# Altium footprint library ICs And Semiconductors THD.PcbLib: 350 footprints (part 9 of 22) (continued)
## HAMAMATSU_S11105 [mm] "22 Leads Dual In-Line Package, Row Spacing 10.16mm; Pitch 2.54mm" (continued)
3D body "HAMAMATSU_S11105.stp": height 3, standoff -4.3, extent -5.205,-15.875 5.205,15.875

## HAMAMATSU_S12572-010C [mm] "3x3mm Single Element MPPC (Multi-Pixel Photon Counter)"
height 4
pads (2):
  round 1.4 hole 0.7: 1(2,-1.27) 2(2,1.27)
Top Overlay:
  lines w0.2: 0.924,-1.5 -1.83,-1.5 -1.83,1.5 0.924,1.5 ; 0.988,-1.7 -2.03,-1.7 -2.03,1.7 0.988,1.7 ; 1.17,-0.548 1.17,0.548 ; 1.37,-0.368 1.37,0.368 ; 2.115,-2.45 2.115,-2.364 ; 2.115,-0.176 2.115,0.176 ; 2.115,2.364 2.115,2.45 ; 2.775,-2.051 2.775,-2.45 -2.775,-2.45 -2.775,2.45 2.775,2.45 2.775,2.051 ; 2.775,-0.489 2.775,0.489 ; -3.35,-3.025 -3.35,3.025 3.35,3.025 3.35,-3.025 -3.35,-3.025
  text "C" at 3.9,0.7 h1.2
  text "A" at 3.9,-1.8 h1.2
Notvisible:
  lines w0.1: -0.5,0 0,0 ; 0,-0.5 0,0 ; 0,0.5 0,0 ; 0.5,0 0,0 ; 1.5,-1.27 2,-1.27 ; 1.5,1.27 2,1.27 ; 2,-1.77 2,-1.27 ; 2,-0.77 2,-1.27 ; 2,0.77 2,1.27 ; 2,1.77 2,1.27 ; 2.5,-1.27 2,-1.27 ; 2.5,1.27 2,1.27
Mechanical 14:
  lines w0.1: 2.115,-2.45 2.115,2.45 ; -3.35,-3.025 -3.35,3.025 3.35,3.025 3.35,-3.025 -3.35,-3.025 ; -2.775,-2.45 2.775,-2.45 2.775,2.45 -2.775,2.45 -2.775,-2.45 ; -2.03,-1.7 1.37,-1.7 1.37,1.7 -2.03,1.7 -2.03,-1.7 ; -1.83,-1.5 1.17,-1.5 1.17,1.5 -1.83,1.5 -1.83,-1.5
3D body "HAMAMATSU_S12572-010C.stp": height 2.2, standoff -3.6, extent -3.275,-2.95 3.275,2.95

## INFINEON_ECONODUAL2 [mm] "INFINEON EconoDUAL 2 Module"
height 17.5
pads (16):
  round 2.4 hole 1.7: 1(-13.33,20.95) 2(-9.52,20.95) 3(13.34,20.95) 4(17.15,20.95) 7(28.58,-20.95) 8(24.77,-20.95) 9(-5.71,-20.95) 10(-9.52,-20.95) 11(-24.76,-20.95) 12(-28.57,-20.95)
  rrect20% 12x13 hole 6.5: 5(53.8,14) 6(53.8,-14) 13(-53.8,-14) 14(-53.8,14)
  round 1 hole 12 unplated mask+5.5: MEC(-46.5,0) MEC(46.5,0)
Top Overlay:
  lines w0.2: -52.025,-7 -52.025,7 ; -47.3,-19.15 47.3,-19.15 ; -47.3,19.15 47.3,19.15 ; 52.025,-7 52.025,7 ; -61,-22.5 -61,-6.028 -53.6,-6.028 -53.6,6.028 -61,6.028 -61,22.5 61,22.5 61,6.028 53.6,6.028 53.6,-6.028 61,-6.028 61,-22.5 -61,-22.5
  text "6" at 50.434,-6.7 h1.2
  text "5" at 50.134,5.4 h1.2
  text "14" at -50.78,5.45 h1.2
  text "13" at -50.78,-6.45 h1.2
  text "12" at -29.25,-18.6 h1.2
  text "11" at -25.44,-18.6 h1.2
  text "10" at -10.2,-18.6 h1.2
  text "9" at -5.99,-18.7 h1.2
  text "8" at 24.49,-18.7 h1.2
  text "7" at 28.3,-18.7 h1.2
  text "4" at 16.8,17.6 h1.2
  text "3" at 13.034,17.6 h1.2
  text "2" at -9.8,17.6 h1.2
  text "1" at -13.6,17.6 h1.2
Notvisible:
  circle w0.1: c-13.33,20.95 r1.5
  lines w0.1: -54.3,-14 -53.8,-14 ; -54.3,14 -53.8,14 ; -53.8,-14.5 -53.8,-14 ; -53.8,-13.5 -53.8,-14 ; -53.8,13.5 -53.8,14 ; -53.8,14.5 -53.8,14 ; -53.3,-14 -53.8,-14 ; -53.3,14 -53.8,14 ; -47,0 -46.5,0 ; -46.5,-0.5 -46.5,0 ; -46.5,0.5 -46.5,0 ; -46,0 -46.5,0 ; -29.07,-20.95 -28.57,-20.95 ; -28.57,-21.45 -28.57,-20.95 ; -28.57,-20.45 -28.57,-20.95 ; -28.07,-20.95 -28.57,-20.95 ; -25.26,-20.95 -24.76,-20.95 ; -24.76,-21.45 -24.76,-20.95 ; -24.76,-20.45 -24.76,-20.95 ; -24.26,-20.95 -24.76,-20.95 ; -13.83,20.95 -13.33,20.95 ; -13.33,20.45 -13.33,20.95 ; -13.33,21.45 -13.33,20.95 ; -12.83,20.95 -13.33,20.95 ; -10.02,-20.95 -9.52,-20.95 ; -10.02,20.95 -9.52,20.95 ; -9.52,-21.45 -9.52,-20.95 ; -9.52,-20.45 -9.52,-20.95 ; -9.52,20.45 -9.52,20.95 ; -9.52,21.45 -9.52,20.95 ; -9.02,-20.95 -9.52,-20.95 ; -9.02,20.95 -9.52,20.95 ; -6.21,-20.95 -5.71,-20.95 ; -5.71,-21.45 -5.71,-20.95 ; -5.71,-20.45 -5.71,-20.95 ; -5.21,-20.95 -5.71,-20.95 ; -0.5,0 0,0 ; 0,-0.5 0,0 ; 0,0.5 0,0 ; 0.5,0 0,0 ; 12.84,20.95 13.34,20.95 ; 13.34,20.45 13.34,20.95 ; 13.34,21.45 13.34,20.95 ; 13.84,20.95 13.34,20.95 ; 16.65,20.95 17.15,20.95 ; 17.15,20.45 17.15,20.95 ; 17.15,21.45 17.15,20.95 ; 17.65,20.95 17.15,20.95 ; 24.27,-20.95 24.77,-20.95 ; 24.77,-21.45 24.77,-20.95 ; 24.77,-20.45 24.77,-20.95 ; 25.27,-20.95 24.77,-20.95 ; 28.08,-20.95 28.58,-20.95 ; 28.58,-21.45 28.58,-20.95 ; 28.58,-20.45 28.58,-20.95 ; 29.08,-20.95 28.58,-20.95 ; 46,0 46.5,0 ; 46.5,-0.5 46.5,0 ; 46.5,0.5 46.5,0 ; 47,0 46.5,0 ; 53.3,-14 53.8,-14 ; 53.3,14 53.8,14 ; 53.8,-14.5 53.8,-14 ; 53.8,-13.5 53.8,-14 ; 53.8,13.5 53.8,14 ; 53.8,14.5 53.8,14 ; 54.3,-14 53.8,-14 ; 54.3,14 53.8,14 ; -59.8,-19.3 -58.6,-20.5 -49,-20.5 -47.8,-19.3 -47.8,-8.7 -49,-7.5 -58.6,-7.5 -59.8,-8.7 -59.8,-19.3 ; -59.8,8.7 -59.8,19.3 -58.6,20.5 -49,20.5 -47.8,19.3 -47.8,8.7 -49,7.5 -58.6,7.5 -59.8,8.7 ; 47.8,-19.3 47.8,-8.7 49,-7.5 58.6,-7.5 59.8,-8.7 59.8,-19.3 58.6,-20.5 49,-20.5 47.8,-19.3 ; 47.8,8.7 47.8,19.3 49,20.5 58.6,20.5 59.8,19.3 59.8,8.7 58.6,7.5 49,7.5 47.8,8.7
Mechanical 14:
  lines w0.1: -55.1,-22.5 -55.1,-6.028 ; -55.1,6.028 -55.1,22.5 ; -53.6,-22.5 -53.6,22.5 ; -53.6,-6.028 -61,-6.028 -61,-22.5 61,-22.5 61,-6.028 53.6,-6.028 ; -53.6,6.028 -61,6.028 -61,22.5 61,22.5 61,6.028 53.6,6.028 ; 53.6,-22.5 53.6,22.5 ; 55.1,-22.5 55.1,-6.028 ; 55.1,6.028 55.1,22.5 ; -52.4,-19.15 52.4,-19.15 52.4,19.15 -52.4,19.15 -52.4,-19.15
  text "6" at 50.434,-6.7 h1.2
  text "5" at 50.134,5.4 h1.2
  text "14" at -50.78,5.45 h1.2
  text "13" at -50.78,-6.45 h1.2
  text "12" at -29.25,-18.6 h1.2
  text "11" at -25.44,-18.6 h1.2
  text "10" at -10.2,-18.6 h1.2
  text "9" at -5.99,-18.7 h1.2
  text "8" at 24.49,-18.7 h1.2
  text "7" at 28.3,-18.7 h1.2
  text "4" at 16.8,17.6 h1.2
  text "3" at 13.034,17.6 h1.2
  text "2" at -9.8,17.6 h1.2
  text "1" at -13.6,17.6 h1.2
3D body "INFINEON_ECONODUAL2.stp": height 17, standoff -3.5, extent -61,-22.5 61,22.5

## INFINEON_ECONODUAL2_a [mm] "INFINEON EconoDUAL 2 Module"
height 17.5
pads (10):
  round 2.4 hole 1.7: 1(-13.33,20.95) 2(-9.52,20.95) 3(13.34,20.95) 4(17.15,20.95) 7(28.58,-20.95) 8(24.77,-20.95) 9(-5.71,-20.95) 10(-9.52,-20.95) 11(-24.76,-20.95) 12(-28.57,-20.95)
Top Overlay:
  lines w0.2: -52.025,-7 -52.025,7 ; -47.3,-19.15 47.3,-19.15 ; -47.3,19.15 47.3,19.15 ; 52.025,-7 52.025,7 ; -61,-22.5 61,-22.5 61,-6.028 53.6,-6.028 53.6,6.028 61,6.028 61,22.5 -61,22.5 -61,6.028 -53.6,6.028 -53.6,-6.028 -61,-6.028 -61,-22.5
  text "1" at -13.6,17.6 h1.2
  text "2" at -9.8,17.6 h1.2
  text "3" at 13.034,17.6 h1.2
  text "4" at 16.8,17.6 h1.2
  text "7" at 28.3,-18.7 h1.2
  text "8" at 24.49,-18.7 h1.2
  text "9" at -5.99,-18.7 h1.2
  text "10" at -10.2,-18.6 h1.2
  text "11" at -25.44,-18.6 h1.2
  text "12" at -29.25,-18.6 h1.2
  text "13" at -50.78,-6.45 h1.2
  text "14" at -50.78,5.45 h1.2
  text "5" at 50.134,5.4 h1.2
  text "6" at 50.434,-6.7 h1.2
Notvisible:
  circle w0.1: c-13.33,20.95 r1.5
  lines w0.1: -54.3,-14 -53.8,-14 ; -54.3,14 -53.8,14 ; -53.8,-14.5 -53.8,-14 ; -53.8,-13.5 -53.8,-14 ; -53.8,13.5 -53.8,14 ; -53.8,14.5 -53.8,14 ; -53.3,-14 -53.8,-14 ; -53.3,14 -53.8,14 ; -47,0 -46.5,0 ; -46.5,-0.5 -46.5,0 ; -46.5,0.5 -46.5,0 ; -46,0 -46.5,0 ; -29.07,-20.95 -28.57,-20.95 ; -28.57,-21.45 -28.57,-20.95 ; -28.57,-20.45 -28.57,-20.95 ; -28.07,-20.95 -28.57,-20.95 ; -25.26,-20.95 -24.76,-20.95 ; -24.76,-21.45 -24.76,-20.95 ; -24.76,-20.45 -24.76,-20.95 ; -24.26,-20.95 -24.76,-20.95 ; -13.83,20.95 -13.33,20.95 ; -13.33,20.45 -13.33,20.95 ; -13.33,21.45 -13.33,20.95 ; -12.83,20.95 -13.33,20.95 ; -10.02,-20.95 -9.52,-20.95 ; -10.02,20.95 -9.52,20.95 ; -9.52,-21.45 -9.52,-20.95 ; -9.52,-20.45 -9.52,-20.95 ; -9.52,20.45 -9.52,20.95 ; -9.52,21.45 -9.52,20.95 ; -9.02,-20.95 -9.52,-20.95 ; -9.02,20.95 -9.52,20.95 ; -6.21,-20.95 -5.71,-20.95 ; -5.71,-21.45 -5.71,-20.95 ; -5.71,-20.45 -5.71,-20.95 ; -5.21,-20.95 -5.71,-20.95 ; -0.5,0 0,0 ; 0,-0.5 0,0 ; 0,0.5 0,0 ; 0.5,0 0,0 ; 12.84,20.95 13.34,20.95 ; 13.34,20.45 13.34,20.95 ; 13.34,21.45 13.34,20.95 ; 13.84,20.95 13.34,20.95 ; 16.65,20.95 17.15,20.95 ; 17.15,20.45 17.15,20.95 ; 17.15,21.45 17.15,20.95 ; 17.65,20.95 17.15,20.95 ; 24.27,-20.95 24.77,-20.95 ; 24.77,-21.45 24.77,-20.95 ; 24.77,-20.45 24.77,-20.95 ; 25.27,-20.95 24.77,-20.95 ; 28.08,-20.95 28.58,-20.95 ; 28.58,-21.45 28.58,-20.95 ; 28.58,-20.45 28.58,-20.95 ; 29.08,-20.95 28.58,-20.95 ; 46,0 46.5,0 ; 46.5,-0.5 46.5,0 ; 46.5,0.5 46.5,0 ; 47,0 46.5,0 ; 53.3,-14 53.8,-14 ; 53.3,14 53.8,14 ; 53.8,-14.5 53.8,-14 ; 53.8,-13.5 53.8,-14 ; 53.8,13.5 53.8,14 ; 53.8,14.5 53.8,14 ; 54.3,-14 53.8,-14 ; 54.3,14 53.8,14 ; -59.8,-19.3 -59.8,-8.7 -58.6,-7.5 -49,-7.5 -47.8,-8.7 -47.8,-19.3 -49,-20.5 -58.6,-20.5 -59.8,-19.3 ; -59.8,8.7 -58.6,7.5 -49,7.5 -47.8,8.7 -47.8,19.3 -49,20.5 -58.6,20.5 -59.8,19.3 -59.8,8.7 ; 47.8,-19.3 49,-20.5 58.6,-20.5 59.8,-19.3 59.8,-8.7 58.6,-7.5 49,-7.5 47.8,-8.7 47.8,-19.3 ; 47.8,8.7 49,7.5 58.6,7.5 59.8,8.7 59.8,19.3 58.6,20.5 49,20.5 47.8,19.3 47.8,8.7
Mechanical 14:
  lines w0.1: -55.1,-22.5 -55.1,-6.028 ; -55.1,6.028 -55.1,22.5 ; -53.6,-22.5 -53.6,22.5 ; -53.6,-6.028 -61,-6.028 -61,-22.5 61,-22.5 61,-6.028 53.6,-6.028 ; -53.6,6.028 -61,6.028 -61,22.5 61,22.5 61,6.028 53.6,6.028 ; 53.6,-22.5 53.6,22.5 ; 55.1,-22.5 55.1,-6.028 ; 55.1,6.028 55.1,22.5 ; -52.4,-19.15 -52.4,19.15 52.4,19.15 52.4,-19.15 -52.4,-19.15
  text "1" at -13.6,17.6 h1.2
  text "2" at -9.8,17.6 h1.2
  text "3" at 13.034,17.6 h1.2
  text "4" at 16.8,17.6 h1.2
  text "7" at 28.3,-18.7 h1.2
  text "8" at 24.49,-18.7 h1.2
  text "9" at -5.99,-18.7 h1.2
  text "10" at -10.2,-18.6 h1.2
  text "11" at -25.44,-18.6 h1.2
  text "12" at -29.25,-18.6 h1.2
  text "13" at -50.78,-6.45 h1.2
  text "14" at -50.78,5.45 h1.2
  text "5" at 50.134,5.4 h1.2
  text "6" at 50.434,-6.7 h1.2
3D body "INFINEON_ECONODUAL2.stp": height 17, standoff -3.5, extent -61,-22.5 61,22.5

## IXYS_IXBOD 1-06..10 [mm] "Lead spacing 7.5mm Body 10mm X 4mm"
height 9
pads (2):
  round 1.9 hole 1.2: 1(-3.75,0) 2(3.75,0)
Top Overlay:
  lines w0.2: -4.816,1.5 4.816,1.5 ; -5,0 -4.693,2.5 4.693,2.5 5,0 4.816,-1.5 -4.816,-1.5 -5,0
Notvisible:
  lines w0.1: -4.25,0 -3.75,0 ; -3.75,-0.5 -3.75,0 ; -3.75,0.5 -3.75,0 ; -3.25,0 -3.75,0 ; -0.5,0 0,0 ; 0,-0.5 0,0 ; 0,0.5 0,0 ; 0.5,0 0,0 ; 3.25,0 3.75,0 ; 3.75,-0.5 3.75,0 ; 3.75,0.5 3.75,0 ; 4.25,0 3.75,0
Mechanical 14:
  lines w0.1: -4.816,1.5 4.816,1.5 ; -5,0 -4.693,2.5 4.693,2.5 5,0 4.816,-1.5 -4.816,-1.5 -5,0
3D body "IXYS_IXBOD 1-06..10.stp": height 9, standoff -4, extent -5,-1.5 5,2.5

## IXYS_IXBOD 1-12R..42 [mm] "Lead spacing 45.7mm Body 54.5mm X 7.5mm"
height 19
pads (2):
  round 1.9 hole 1.2: 1(-22.86,0) 2(22.86,0)
Top Overlay:
  lines w0.2: -24.75,-3.75 -24.75,3.75 ; -3.75,0 3.75,0 ; -0.866,0 0.866,-1 0.866,1 ; -27.25,-3.75 27.25,-3.75 27.25,3.75 -27.25,3.75 -27.25,-3.75
  text "K" at -18.454,-0.75 h1.5
  text "A" at 17.175,-0.75 h1.5
Notvisible:
  lines w0.1: -23.35,0 -22.85,0 ; -22.85,-0.5 -22.85,0 ; -22.85,0.5 -22.85,0 ; -22.35,0 -22.85,0 ; -0.5,0 0,0 ; 0,-0.5 0,0 ; 0,0.5 0,0 ; 0.5,0 0,0 ; 22.35,0 22.85,0 ; 22.85,-0.5 22.85,0 ; 22.85,0.5 22.85,0 ; 23.35,0 22.85,0
Mechanical 14:
  lines w0.1: -24.75,-3.75 -24.75,3.75 ; -3.75,0 3.75,0 ; -0.866,0 0.866,-1 0.866,1 ; -27.25,-3.75 27.25,-3.75 27.25,3.75 -27.25,3.75 -27.25,-3.75
  text "K" at -18.454,-0.75 h1.5
  text "A" at 17.175,-0.75 h1.5
3D body "IXYS_IXBOD 1-12..42.stp": height 19, standoff -3.1, extent -27.25,-3.75 27.25,3.75

## IXYS_PLUS247_FLIP [mm] "IXYS PLUS247 Case, Lead spacing 5.45mm Body 21.07mm X 15.94mm - Flipped Horizontal Mount"
height 5.21
pads (3):
  round 2.5 hole 1.8: 1(5.45,0) 2(0,0) 3(-5.45,0)
Top Overlay:
  lines w0.2: -7.62,7.545 -7.62,7.175 ; -7.62,8.545 -7.62,9.545 ; -7.62,10.545 -7.62,11.545 ; -7.62,12.545 -7.62,13.545 ; -7.62,14.545 -7.62,15.545 ; -7.62,16.545 -7.62,17.545 ; -7.62,18.545 -7.62,19.545 ; -7.62,20.545 -7.62,21.545 ; -7.62,22.545 -7.62,23.545 ; -7.62,24.545 -7.62,25.545 ; -7.62,26.545 -7.62,27.545 -6.62,27.545 ; -6.62,7.175 -7.62,7.175 ; -6.515,6.825 -6.515,2.505 -4.385,2.505 -4.385,6.825 ; -6.15,1.549 -6.15,2.505 ; -5.62,7.175 -4.62,7.175 ; -5.62,27.545 -4.62,27.545 ; -4.75,1.549 -4.75,2.505 ; -3.62,7.175 -2.62,7.175 ; -3.62,27.545 -2.62,27.545 ; -1.62,7.175 -0.62,7.175 ; -1.62,27.545 -0.62,27.545 ; -1.56,6.825 -1.56,2.505 1.56,2.505 1.56,6.825 ; -0.7,1.549 -0.7,2.505 ; 0.38,7.175 1.38,7.175 ; 0.38,27.545 1.38,27.545 ; 0.7,1.549 0.7,2.505 ; 2.38,7.175 3.38,7.175 ; 2.38,27.545 3.38,27.545 ; 4.38,7.175 5.38,7.175 ; 4.38,27.545 5.38,27.545 ; 4.385,6.825 4.385,2.505 6.515,2.505 6.515,6.825 ; 4.75,1.549 4.75,2.505 ; 6.15,1.549 6.15,2.505 ; 6.38,7.175 7.62,7.175 ; 6.38,27.545 7.62,27.545 ; 7.62,7.545 7.62,7.175 ; 7.62,8.545 7.62,9.545 ; 7.62,10.545 7.62,11.545 ; 7.62,12.545 7.62,13.545 ; 7.62,14.545 7.62,15.545 ; 7.62,16.545 7.62,17.545 ; 7.62,18.545 7.62,19.545 ; 7.62,20.545 7.62,21.545 ; 7.62,22.545 7.62,23.545 ; 7.62,24.545 7.62,25.545 ; 7.62,26.545 7.62,27.545 ; -7.97,6.825 7.97,6.825 ; -7.97,6.825 -7.97,27.895 7.97,27.895 ; -7.97,6.825 -7.62,7.175 ; 7.62,7.175 7.97,6.825 ; 7.62,27.545 7.97,27.895 ; 7.97,6.825 7.97,27.895 ; -6.7,9.525 -6.7,25.025 -4.7,26.025 4.7,26.025 6.7,25.025 6.7,9.525 -6.7,9.525
Notvisible:
  lines w0.1: -5.95,0 -5.45,0 ; -5.45,-0.5 -5.45,0 ; -5.45,0.5 -5.45,0 ; -4.95,0 -5.45,0 ; -0.5,0 0,0 ; -0.5,22 0,22 ; 0,-0.5 0,0 ; 0,0.5 0,0 ; 0,21.5 0,22 ; 0,22.5 0,22 ; 0.5,0 0,0 ; 0.5,22 0,22 ; 4.95,0 5.45,0 ; 5.45,-0.5 5.45,0 ; 5.45,0.5 5.45,0 ; 5.95,0 5.45,0
Mechanical 14:
  lines w0.1: -7.62,7.545 -7.62,7.175 ; -7.62,8.545 -7.62,9.545 ; -7.62,10.545 -7.62,11.545 ; -7.62,12.545 -7.62,13.545 ; -7.62,14.545 -7.62,15.545 ; -7.62,16.545 -7.62,17.545 ; -7.62,18.545 -7.62,19.545 ; -7.62,20.545 -7.62,21.545 ; -7.62,22.545 -7.62,23.545 ; -7.62,24.545 -7.62,25.545 ; -7.62,26.545 -7.62,27.545 -6.62,27.545 ; -6.62,7.175 -7.62,7.175 ; -6.515,6.825 -6.515,2.505 -4.385,2.505 -4.385,6.825 ; -6.15,2.505 -6.15,-0.4 -4.75,-0.4 -4.75,2.505 ; -5.62,7.175 -4.62,7.175 ; -5.62,27.545 -4.62,27.545 ; -3.62,7.175 -2.62,7.175 ; -3.62,27.545 -2.62,27.545 ; -1.62,7.175 -0.62,7.175 ; -1.62,27.545 -0.62,27.545 ; -1.56,6.825 -1.56,2.505 1.56,2.505 1.56,6.825 ; -0.7,2.505 -0.7,-0.4 0.7,-0.4 0.7,2.505 ; 0.38,7.175 1.38,7.175 ; 0.38,27.545 1.38,27.545 ; 2.38,7.175 3.38,7.175 ; 2.38,27.545 3.38,27.545 ; 4.38,7.175 5.38,7.175 ; 4.38,27.545 5.38,27.545 ; 4.385,6.825 4.385,2.505 6.515,2.505 6.515,6.825 ; 4.75,2.505 4.75,-0.4 6.15,-0.4 6.15,2.505 ; 6.38,7.175 7.62,7.175 ; 6.38,27.545 7.62,27.545 ; 7.62,7.545 7.62,7.175 ; 7.62,8.545 7.62,9.545 ; 7.62,10.545 7.62,11.545 ; 7.62,12.545 7.62,13.545 ; 7.62,14.545 7.62,15.545 ; 7.62,16.545 7.62,17.545 ; 7.62,18.545 7.62,19.545 ; 7.62,20.545 7.62,21.545 ; 7.62,22.545 7.62,23.545 ; 7.62,24.545 7.62,25.545 ; 7.62,26.545 7.62,27.545 ; -7.97,6.825 -7.97,27.895 7.97,27.895 ; -7.97,6.825 -7.62,7.175 ; -7.97,6.825 7.97,6.825 ; 7.62,7.175 7.97,6.825 ; 7.62,27.545 7.97,27.895 ; 7.97,6.825 7.97,27.895 ; -6.7,9.525 -6.7,25.025 -4.7,26.025 4.7,26.025 6.7,25.025 6.7,9.525 -6.7,9.525
3D body "IXYS_PLUS247_FLIP.stp": height 5.02, standoff -4.21, extent -7.97,-0.4 7.97,27.895

## IXYS_PLUS247_H [mm] "IXYS PLUS247 Case, Lead spacing 5.45mm Body 21.07mm X 15.94mm - Horizontal Mount"
height 5.21
pads (4):
  round 2.5 hole 1.8: 1(-5.45,0) 2(0,0) 3(5.45,0)
  rect 14.4x18.5 smd paste-9.25: 4(0,17.775)
Top Overlay:
  lines w0.2: -7.5,19.418 -7.62,19.403 ; -7.5,19.77 -7.97,19.713 -7.62,19.403 ; -7.5,24.23 -7.97,24.288 -7.62,24.597 ; -7.5,24.582 -7.62,24.597 ; -6.515,6.825 -7.97,6.825 ; -6.515,7.175 -6.515,2.505 -4.385,2.505 -4.385,7.175 ; -6.15,1.549 -6.15,2.505 ; -4.75,1.549 -4.75,2.505 ; -4.385,6.825 -1.56,6.825 ; -1.56,7.175 -1.56,2.505 1.56,2.505 1.56,7.175 ; -0.7,1.549 -0.7,2.505 ; 0.7,1.549 0.7,2.505 ; 1.56,6.825 4.385,6.825 ; 4.385,7.175 4.385,2.505 6.515,2.505 6.515,7.175 ; 4.75,1.549 4.75,2.505 ; 6.15,1.549 6.15,2.505 ; 6.515,6.825 7.97,6.825 ; 7.5,19.418 7.62,19.403 ; 7.5,19.77 7.97,19.713 7.62,19.403 ; 7.5,24.23 7.97,24.288 7.62,24.597 ; 7.5,24.582 7.62,24.597 ; -7.97,6.825 -7.62,7.175 ; -7.97,6.825 -7.97,27.895 7.97,27.895 ; -7.62,7.175 -7.62,19.403 ; -7.62,7.175 7.62,7.175 ; -7.62,24.597 -7.62,27.545 7.62,27.545 ; 7.62,7.175 7.62,19.403 ; 7.62,7.175 7.97,6.825 ; 7.62,24.597 7.62,27.545 ; 7.62,27.545 7.97,27.895 ; 7.97,6.825 7.97,27.895
Notvisible:
  lines w0.1: -5.95,0 -5.45,0 ; -5.45,-0.5 -5.45,0 ; -5.45,0.5 -5.45,0 ; -4.95,0 -5.45,0 ; -0.5,0 0,0 ; -0.5,17.36 0,17.36 ; -0.5,22 0,22 ; 0,-0.5 0,0 ; 0,0.5 0,0 ; 0,16.86 0,17.36 ; 0,21.5 0,22 ; 0,22.5 0,22 ; 0.5,0 0,0 ; 0.5,17.36 0,17.36 ; 0.5,22 0,22 ; 4.95,0 5.45,0 ; 5.45,-0.5 5.45,0 ; 5.45,0.5 5.45,0 ; 5.95,0 5.45,0 ; -7.2,8.525 -7.2,27.025 ; -7.2,8.525 7.2,8.525 ; -7.2,8.525 0,17.775 ; -7.2,27.025 7.2,27.025 ; -7.2,27.025 0,17.775 ; 0,17.775 7.2,8.525 ; 0,17.775 7.2,27.025 ; 7.2,8.525 7.2,27.025 ; -6.7,9.525 -6.7,26.025 6.7,26.025 6.7,9.525 -6.7,9.525
Mechanical 14:
  lines w0.1: -6.515,6.825 -7.97,6.825 ; -6.515,7.175 -6.515,2.505 -4.385,2.505 -4.385,7.175 ; -6.15,2.505 -6.15,-0.4 -4.75,-0.4 -4.75,2.505 ; -4.385,6.825 -1.56,6.825 ; -1.56,7.175 -1.56,2.505 1.56,2.505 1.56,7.175 ; -0.7,2.505 -0.7,-0.4 0.7,-0.4 0.7,2.505 ; 1.56,6.825 4.385,6.825 ; 4.385,7.175 4.385,2.505 6.515,2.505 6.515,7.175 ; 4.75,2.505 4.75,-0.4 6.15,-0.4 6.15,2.505 ; 6.515,6.825 7.97,6.825 ; -7.97,6.825 -7.62,7.175 ; -7.97,6.825 -7.97,27.895 7.97,27.895 ; -7.62,7.175 -7.62,19.403 ; -7.62,7.175 7.62,7.175 ; -7.62,19.403 -7.97,19.713 -6.47,19.897 ; -7.62,19.403 -6.12,19.587 ; -7.62,24.597 -6.12,24.413 ; -7.62,24.597 -7.97,24.288 -6.47,24.103 ; -7.62,24.597 -7.62,27.545 7.62,27.545 ; -6.47,19.897 -6.12,19.587 ; -6.47,19.897 -6.47,24.103 ; -6.47,24.103 -6.12,24.413 ; -6.12,19.587 -6.12,24.413 ; 6.12,19.587 6.12,24.413 ; 6.12,19.587 6.47,19.897 ; 6.12,19.587 7.62,19.403 ; 6.12,24.413 7.62,24.597 ; 6.12,24.413 6.47,24.103 ; 6.47,19.897 7.97,19.713 7.62,19.403 ; 6.47,19.897 6.47,24.103 ; 6.47,24.103 7.97,24.288 7.62,24.597 ; 7.62,7.175 7.62,19.403 ; 7.62,7.175 7.97,6.825 ; 7.62,24.597 7.62,27.545 ; 7.62,27.545 7.97,27.895 ; 7.97,6.825 7.97,27.895
3D body "IXYS_PLUS247_H.stp": height 5.02, standoff -3.6, extent -7.97,-0.4 7.97,27.895

## IXYS_PLUS247_V [mm] "IXYS PLUS247 Case, Lead spacing 5.45mm Body 21.07mm X 15.94mm - Vertical Mount"
height 25.66
pads (3):
  round 2.5 hole 1.8: 1(-5.45,0) 3(5.45,0)
  oval 3.2x2.5 hole 1.8: 2(0,0)
Top Overlay:
  lines w0.2: -6.964,0.655 -7.97,0.655 ; -3.936,0.655 -1.795,0.655 ; 1.795,0.655 3.936,0.655 ; 6.964,0.655 7.97,0.655 ; -7.97,0.655 -7.62,-2.205 7.623,-2.205 7.97,0.655 ; -7.97,0.655 -7.97,2.815 7.97,2.815 7.97,0.655
Notvisible:
  lines w0.1: -5.95,0 -5.45,0 ; -5.45,-0.5 -5.45,0 ; -5.45,0.5 -5.45,0 ; -4.95,0 -5.45,0 ; -0.5,0 0,0 ; 0,-0.5 0,0 ; 0,0.5 0,0 ; 0.5,0 0,0 ; 4.95,0 5.45,0 ; 5.45,-0.5 5.45,0 ; 5.45,0.5 5.45,0 ; 5.95,0 5.45,0
Mechanical 14:
  lines w0.1: 7.62,-2.205 7.97,0.655 ; 7.623,-2.205 -7.62,-2.205 -7.97,0.655 ; -7.97,0.655 -7.97,2.815 7.97,2.815 7.97,0.655 ; -7.97,0.655 7.97,0.655
3D body "IXYS_PLUS247_V.stp": height 25.4, standoff -4.95, extent -7.97,-2.205 7.97,2.815

## IXYS_SOT-227B_FLIP [mm] "IXYS SOT-227B (Minibloc) Case, Body 38.01mm x 25.42mm, Screws on PCB Version"
height 12.22
pads (4):
  rrect50% 9.5x9.5 hole 4.4: 1(-7.5,6.35) 2(7.5,6.35) 3(7.5,-6.35) 4(-7.5,-6.35)
via 10.25,4.763 diameter 1 hole 0.5
via 7.5,3.175 diameter 1 hole 0.5
via 4.75,4.763 diameter 1 hole 0.5
via 4.75,7.938 diameter 1 hole 0.5
via 7.5,9.525 diameter 1 hole 0.5
via 10.25,7.938 diameter 1 hole 0.5
via -4.75,4.763 diameter 1 hole 0.5
via -7.5,3.175 diameter 1 hole 0.5
via -10.25,4.763 diameter 1 hole 0.5
via -10.25,7.938 diameter 1 hole 0.5
via -7.5,9.525 diameter 1 hole 0.5
via -4.75,7.938 diameter 1 hole 0.5
via 10.25,-7.938 diameter 1 hole 0.5
via 7.5,-9.525 diameter 1 hole 0.5
via 4.75,-7.938 diameter 1 hole 0.5
via 4.75,-4.763 diameter 1 hole 0.5
via 7.5,-3.175 diameter 1 hole 0.5
via 10.25,-4.763 diameter 1 hole 0.5
via -4.75,-7.938 diameter 1 hole 0.5
via -7.5,-9.525 diameter 1 hole 0.5
via -10.25,-7.938 diameter 1 hole 0.5
via -10.25,-4.763 diameter 1 hole 0.5
via -7.5,-3.175 diameter 1 hole 0.5
via -4.75,-4.763 diameter 1 hole 0.5
Top Overlay:
  circle w0.2: c-15.1,0 r2.15
  lines w0.2: -15.85,-11.521 -15.85,-12.479 ; -15.85,-10.521 -15.85,-9.521 ; -15.85,9.479 -15.85,10.479 ; -15.85,11.479 -15.85,12.479 ; -15.628,-8.521 -15.043,-7.521 ; -15.603,8.479 -15.018,7.479 ; -14.457,-6.521 -13.871,-5.521 ; -14.432,6.479 -13.847,5.479 ; -13.286,-4.521 -12.7,-3.521 ; -13.261,4.479 -12.676,3.479 ; -12.115,-2.521 -11.778,-1.945 ccw(c-15.1,0) -11.563,-1.521 ; -12.09,2.479 -11.778,1.945 cw(c-15.1,0) -11.545,1.479 ; -11.285,-0.521 ccw(c-15.1,0) -11.28,0.479 ; 11.28,0.479 ccw(c15.1,0) 11.285,-0.521 ; 11.545,1.479 cw(c15.1,0) 11.778,1.945 12.09,2.479 ; 11.563,-1.521 ccw(c15.1,0) 11.778,-1.945 12.115,-2.521 ; 12.676,3.479 13.261,4.479 ; 12.7,-3.521 13.286,-4.521 ; 13.847,5.479 14.432,6.479 ; 13.871,-5.521 14.457,-6.521 ; 15.018,7.479 15.603,8.479 ; 15.043,-7.521 15.628,-8.521 ; 15.85,-11.521 15.85,-12.479 ; 15.85,-10.521 15.85,-9.521 ; 15.85,9.479 15.85,10.479 ; 15.85,11.479 15.85,12.479 ; -15.85,-12.479 15.85,-12.479 ; -15.85,-12.479 -17.5,-12.479 -19.1,-10.879 -19.1,10.879 -17.5,12.479 -15.85,12.479 ; -15.85,12.479 15.85,12.479 ; 15.1,-2.15 cw(c15.1,0) 15.1,2.15 ; 15.1,-2.15 19.1,-2.15 ; 15.1,-2.15 19.1,-2.15 ; 15.1,2.15 19.1,2.15 ; 15.1,2.15 19.1,2.15 ; 15.85,-12.479 17.5,-12.479 19.1,-10.879 19.1,-2.15 ; 15.85,12.479 17.5,12.479 19.1,10.879 19.1,2.15
Notvisible:
  lines w0.1: -15.1,0 -16.1,0 -15.1,0 ; -15.1,0 -14.1,0 -15.1,0 ; -15.1,0 -15.1,1 -15.1,0 ; -15.1,0 -15.1,-1 -15.1,0 ; -7.5,-6.35 -8.5,-6.35 -7.5,-6.35 ; -7.5,-6.35 -6.5,-6.35 -7.5,-6.35 ; -7.5,-6.35 -7.5,-5.35 -7.5,-6.35 ; -7.5,-6.35 -7.5,-7.35 -7.5,-6.35 ; -7.5,6.35 -8.5,6.35 -7.5,6.35 ; -7.5,6.35 -6.5,6.35 -7.5,6.35 ; -7.5,6.35 -7.5,7.35 -7.5,6.35 ; -7.5,6.35 -7.5,5.35 -7.5,6.35 ; 0,0 -1,0 0,0 ; 0,0 1,0 0,0 ; 0,0 0,1 0,0 ; 0,0 0,-1 0,0 ; 7.5,-6.35 6.5,-6.35 7.5,-6.35 ; 7.5,-6.35 8.5,-6.35 7.5,-6.35 ; 7.5,-6.35 7.5,-5.35 7.5,-6.35 ; 7.5,-6.35 7.5,-7.35 7.5,-6.35 ; 7.5,6.35 6.5,6.35 7.5,6.35 ; 7.5,6.35 8.5,6.35 7.5,6.35 ; 7.5,6.35 7.5,7.35 7.5,6.35 ; 7.5,6.35 7.5,5.35 7.5,6.35 ; 15.1,0 14.1,0 15.1,0 ; 15.1,0 16.1,0 15.1,0 ; 15.1,0 15.1,1 15.1,0 ; 15.1,0 15.1,-1 15.1,0
Mechanical 14:
  circle w0.1: c-7.5,6.35 r2.2
  circle w0.1: c7.5,6.35 r2.2
  circle w0.1: c7.5,-6.35 r2.2
  circle w0.1: c-7.5,-6.35 r2.2
  circle w0.1: c-15.1,0 r2.15
  lines w0.1: -15.85,-11.521 -15.85,-12.479 ; -15.85,-10.521 -15.85,-9.521 ; -15.85,9.479 -15.85,10.479 ; -15.85,11.479 -15.85,12.479 ; -15.628,-8.521 -15.043,-7.521 ; -15.603,8.479 -15.018,7.479 ; -14.457,-6.521 -13.871,-5.521 ; -14.432,6.479 -13.847,5.479 ; -13.286,-4.521 -12.7,-3.521 ; -13.261,4.479 -12.676,3.479 ; -12.115,-2.521 -11.778,-1.945 ccw(c-15.1,0) -11.563,-1.521 ; -12.09,2.479 -11.778,1.945 cw(c-15.1,0) -11.545,1.479 ; -11.5,-10.521 -11.5,-11.314 -11.1,-11.314 ; -11.5,-9.521 -11.5,-8.521 ; -11.5,-7.521 -11.5,-6.521 ; -11.5,-5.521 -11.5,-4.521 ; -11.5,-3.521 -11.5,-3.342 ; -11.5,3.479 -11.5,3.342 -10.637,2.479 ; -11.5,4.479 -11.5,5.479 ; -11.5,6.479 -11.5,7.479 ; -11.5,8.479 -11.5,9.479 ; -11.5,10.479 -11.5,11.314 -11.1,11.314 ; -11.285,-0.521 ccw(c-15.1,0) -11.28,0.479 ; -10.1,-11.314 -9.1,-11.314 ; -10.1,11.314 -9.1,11.314 ; -10,1.842 -9.1,1.842 ; -8.1,-11.314 -7.1,-11.314 ; -8.1,1.842 -7.1,1.842 ; -8.1,11.314 -7.1,11.314 ; -6.1,-11.314 -5.1,-11.314 ; -6.1,1.842 -5.1,1.842 ; -6.1,11.314 -5.1,11.314 ; -5.1,-1.842 -6.1,-1.842 -5,-1.842 ; -4.363,2.479 -3.5,3.342 -3.5,3.479 ; -4.1,-11.314 -3.5,-11.314 -3.5,-10.521 ; -4.1,11.314 -3.5,11.314 -3.5,10.479 ; -3.5,-9.521 -3.5,-8.521 ; -3.5,-7.521 -3.5,-6.521 ; -3.5,-5.521 -3.5,-4.521 ; -3.5,-3.521 -3.5,-3.342 ; -3.5,4.479 -3.5,5.479 ; -3.5,6.479 -3.5,7.479 ; -3.5,8.479 -3.5,9.479 ; 3.5,-10.521 3.5,-11.314 3.9,-11.314 ; 3.5,-9.521 3.5,-8.521 ; 3.5,-7.521 3.5,-6.521 ; 3.5,-5.521 3.5,-4.521 ; 3.5,-3.521 3.5,-3.342 4.321,-2.521 ; 3.5,3.479 3.5,3.342 4.363,2.479 ; 3.5,4.479 3.5,5.479 ; 3.5,6.479 3.5,7.479 ; 3.5,8.479 3.5,9.479 ; 3.5,10.479 3.5,11.314 3.9,11.314 ; 4.9,-11.314 5.9,-11.314 ; 4.9,11.314 5.9,11.314 ; 5,-1.842 5.9,-1.842 ; 5,1.842 5.9,1.842 ; 6.9,-11.314 7.9,-11.314 ; 6.9,-1.842 7.9,-1.842 ; 6.9,1.842 7.9,1.842 ; 6.9,11.314 7.9,11.314 ; 8.9,-11.314 9.9,-11.314 ; 8.9,-1.842 9.9,-1.842 ; 8.9,1.842 9.9,1.842 ; 8.9,11.314 9.9,11.314 ; 10.637,2.479 11.5,3.342 11.5,3.479 ; 10.679,-2.521 11.5,-3.342 11.5,-3.521 ; 10.9,-11.314 11.5,-11.314 11.5,-10.521 ; 10.9,11.314 11.5,11.314 11.5,10.479 ; 11.28,0.479 ccw(c15.1,0) 11.285,-0.521 ; 11.5,-9.521 11.5,-8.521 ; 11.5,-7.521 11.5,-6.521 ; 11.5,-5.521 11.5,-4.521 ; 11.5,4.479 11.5,5.479 ; 11.5,6.479 11.5,7.479 ; 11.5,8.479 11.5,9.479 ; 11.545,1.479 cw(c15.1,0) 11.778,1.945 12.09,2.479 ; 11.563,-1.521 ccw(c15.1,0) 11.778,-1.945 12.115,-2.521 ; 12.676,3.479 13.261,4.479 ; 12.7,-3.521 13.286,-4.521 ; 13.847,5.479 14.432,6.479 ; 13.871,-5.521 14.457,-6.521 ; 15.018,7.479 15.603,8.479 ; 15.043,-7.521 15.628,-8.521 ; 15.85,-11.521 15.85,-12.479 ; 15.85,-10.521 15.85,-9.521 ; 15.85,9.479 15.85,10.479 ; 15.85,11.479 15.85,12.479 ; -15.85,-12.479 -17.5,-12.479 -19.1,-10.879 -19.1,10.879 -17.5,12.479 -15.85,12.479 ; -15.85,-12.479 15.85,-12.479 ; -15.85,12.479 15.85,12.479 ; -11.5,-3.342 -10.679,-2.521 -11.5,-3.342 ; -3.5,-3.342 -4.321,-2.521 -3.5,-3.342 ; 15.1,-2.15 cw(c15.1,0) 15.1,2.15 ; 15.1,-2.15 19.1,-2.15 ; 15.1,-2.15 19.1,-2.15 ; 15.1,2.15 19.1,2.15 ; 15.1,2.15 19.1,2.15 ; 15.85,-12.479 17.5,-12.479 19.1,-10.879 19.1,-2.15 ; 15.85,12.479 17.5,12.479 19.1,10.879 19.1,2.15 ; -10,-1.842 -9.1,-1.842 -10,-1.842 ; -8.1,-1.842 -7.1,-1.842 -8.1,-1.842
3D body "IXYS_SOT-227B_FLIP_Part2.stp": height 10.24, standoff -4.69, extent -11.5,-10.365 11.5,10.365
3D body "IXYS_SOT-227B_FLIP.stp": height 12.02, standoff -4.69, extent -19.05,-12.625 19.05,12.625